# Altium footprint library HEKR V1.1 PCB封装.PcbLib: 2 footprints
Each footprint in its own frame and in the unit in brackets; x right, y up, seen from the top. Pads: shape width x height; smd on the part's side, far side on the other; paste and mask are expansions set on the pad; w line width, h text height; cw(c..) or ccw(c..) is an arc to the next point about the centre after c.
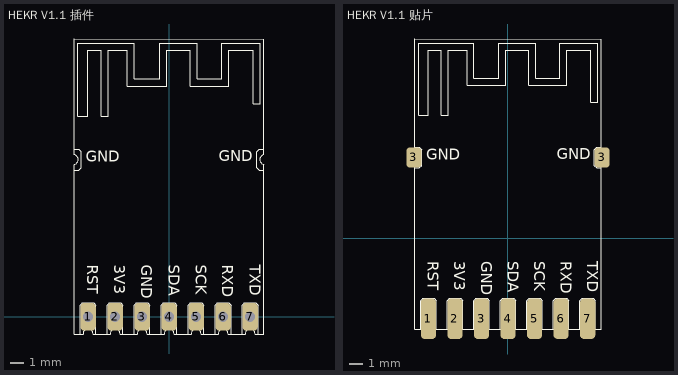
[diagram p0: the footprints below, top view; thin cyan lines are the x and y axes]

## HEKR V1.1 插件 [mil]
pads (7):
  rrect50% 45x80 hole 30: 1(-236.22,0) 2(-157.48,0) 3(-78.74,0) 4(0,0) 5(78.74,0) 6(157.48,0) 7(236.22,0)
Top Overlay:
  circle w1: c236.23,0 r14.65
  circle w1: c157.49,0 r14.65
  circle w1: c78.75,0 r14.65
  circle w1: c0.01,0 r14.65
  circle w1: c-78.73,0 r14.65
  circle w1: c-157.47,0 r14.65
  circle w1: c-236.21,0 r14.65
  lines w1: -276.94,427.82 -263.18,427.82 -256.39,434.61 -256.39,481.98 -257.44,483.03 -263.56,489.15 -276.94,489.15 ; -276.94,428.02 -276.94,443.99 ccw(c-279.42,458.42) -276.96,472.87 -276.96,489 ; -276.95,428.14 -276.95,-51.17 -259.21,-51.17 -250.81,-51.17 ; -276.95,488.79 -276.95,809.96 276.6,809.9 276.6,488.99 ; -259.24,-51.17 -259.24,33.79 -253.16,39.87 -252.68,40.36 -219.64,40.36 -213.11,33.83 -213.11,-51.17 ; -213.28,-51.17 -180.55,-51.18 ; -180.5,-51.17 -180.5,33.79 -174.42,39.87 -173.93,40.36 -140.9,40.36 -134.37,33.83 -134.37,-51.17 ; -180.45,-51.17 -172.07,-51.17 ; -172.08,-51.15 cw(c-157.47,-50) -142.86,-51.2 -134.67,-51.2 ; -134.68,-51.18 -101.73,-51.18 ; -101.76,-51.17 -101.76,33.79 -95.68,39.87 -95.19,40.36 -62.16,40.36 -55.63,33.83 -55.63,-51.17 ; -101.71,-51.17 -93.33,-51.17 ; -55.91,-51.17 -55.93,-51.2 -64.12,-51.2 ccw(c-78.73,-50) -93.34,-51.15 ; -55.74,-51.19 -22.62,-51.19 ; -23.02,-51.17 -23.02,33.79 -16.94,39.87 -16.45,40.36 16.58,40.36 23.11,33.83 23.11,-51.17 ; -22.97,-51.17 -14.59,-51.17 ; 22.56,-51.2 56.09,-51.2 ; 22.83,-51.17 22.81,-51.2 14.62,-51.2 ccw(c0.01,-50) -14.6,-51.15 ; 55.72,-51.17 55.72,33.79 61.8,39.87 62.29,40.36 95.32,40.36 101.85,33.83 101.85,-51.17 ; 55.77,-51.17 64.15,-51.17 ; 101.27,-51.2 134.63,-51.21 ; 134.46,-51.17 134.46,33.79 140.54,39.87 141.03,40.36 174.06,40.36 180.59,33.83 180.59,-51.17 ; 134.51,-51.17 142.89,-51.17 ; 213.2,-51.17 213.2,33.79 219.28,39.87 219.77,40.36 252.8,40.36 259.33,33.83 259.33,-51.17 ; 213.25,-51.17 221.63,-51.17 ; 213.39,-51.21 180.32,-51.21 ; 221.62,-51.15 cw(c236.23,-50) 250.84,-51.2 259.03,-51.2 ; 259.09,-51.22 276.6,-51.22 276.6,427.73 ; 262.83,489.02 276.6,489.02 ; 263.22,427.7 276.6,427.7 ; 276.58,428.01 276.58,443.98 ; 276.58,443.97 cw(c279.06,458.41) 276.6,472.86 ; 276.6,488.83 276.6,472.86 ; 276.58,489.14 263.2,489.14 257.08,483.02 256.03,481.97 256.03,434.6 262.81,427.81 276.58,427.81 276.61,427.84 276.61,443.98 ; -250.82,-51.15 cw(c-236.21,-50) -221.61,-51.2 -213.41,-51.2 ; -250.81,-51.17 -250.81,-51.17 ; -213.41,-51.2 -213.39,-51.17 ; -172.07,-51.17 -172.07,-51.17 ; -134.67,-51.2 -134.65,-51.17 ; -93.33,-51.17 -93.33,-51.17 ; -14.59,-51.17 -14.59,-51.17 ; 64.14,-51.15 cw(c78.75,-50) 93.36,-51.2 101.55,-51.2 ; 64.15,-51.17 64.15,-51.17 ; 101.55,-51.2 101.57,-51.17 ; 142.88,-51.15 cw(c157.49,-50) 172.1,-51.2 180.29,-51.2 ; 142.89,-51.17 142.89,-51.17 ; 180.29,-51.2 180.31,-51.17 ; 221.63,-51.17 221.63,-51.17 ; 259.03,-51.2 259.05,-51.17 ; 276.61,443.98 cw(c279.07,458.42) 276.6,472.86 ; 276.6,472.86 276.6,488.99 ; -265.49,584.46 -265.49,797.36 -101.15,797.36 -101.15,693.45 -26.94,693.45 -26.94,797.54 82.67,797.54 82.67,693.53 153.6,693.53 153.6,797.82 265.87,797.82 265.87,621.89 245.33,621.89 245.33,776.97 173.86,776.97 173.86,672.9 61.85,672.9 61.85,776.77 -6.24,776.77 -6.24,672.9 -121.43,672.9 -121.43,776.58 -177.26,776.58 -177.26,584.3 -197.97,584.3 -197.97,776.56 -236.63,776.56 -236.63,584.45 -265.49,584.46
  text "GND" at 144.91,441.99 h55
  text "GND" at -242.52,440.31 h55
  text "TXD" at 222.93,151.36 h55
  text "RXD" at 144.06,151.31 h55
  text "SCK" at 65.65,151.36 h55
  text "SDA" at -13.22,151.36 h55
  text "GND" at -92.1,151.36 h55
  text "3V3" at -170.97,151.31 h55
  text "RST" at -249.85,151.31 h55

## HEKR V1.1 贴片 [mil]
pads (9):
  rrect50% 45x120 smd: 1(-236.04,-239.21) 2(-157.3,-239.21) 3(-78.56,-239.21) 4(0.18,-239.21) 5(78.92,-239.21) 6(157.66,-239.21) 7(236.41,-239.21)
  rrect50% 45x60 smd: 3(-279.25,239.21) 3(279.25,239.21)
Top Overlay:
  circle w1: c236.42,-219.21 r14.65
  circle w1: c157.68,-219.21 r14.65
  circle w1: c78.94,-219.21 r14.65
  circle w1: c0.2,-219.21 r14.65
  circle w1: c-78.54,-219.21 r14.65
  circle w1: c-157.28,-219.21 r14.65
  circle w1: c-236.02,-219.21 r14.65
  lines w1: -276.78,269.79 -276.78,253.66 cw(c-279.24,239.21) -276.76,224.77 -276.76,208.81 ; -276.76,208.61 -262.99,208.61 -256.21,215.39 -256.21,262.77 -257.26,263.82 -263.38,269.94 -276.76,269.94 ; -276.77,208.93 -276.77,-270.38 -259.02,-270.38 -250.62,-270.38 ; -276.77,269.58 -276.77,590.74 276.78,590.69 276.78,269.77 ; -259.06,-270.38 -259.06,-185.42 -252.98,-179.34 -252.49,-178.86 -219.46,-178.86 -212.93,-185.39 -212.93,-270.39 ; -250.63,-270.36 cw(c-236.02,-269.21) -221.42,-270.41 -213.23,-270.41 -213.2,-270.39 ; -213.09,-270.39 -180.37,-270.39 ; -180.32,-270.38 -180.32,-185.42 -174.24,-179.34 -173.75,-178.86 -140.72,-178.86 -134.19,-185.39 -134.19,-270.39 ; -180.27,-270.38 -171.88,-270.38 ; -171.89,-270.36 cw(c-157.28,-269.21) -142.68,-270.41 -134.49,-270.41 ; -134.46,-270.39 -134.49,-270.41 ; -101.58,-270.38 -101.58,-185.42 -95.5,-179.34 -95.01,-178.86 -61.98,-178.86 -55.45,-185.39 -55.45,-270.39 ; -93.15,-270.36 cw(c-78.54,-269.21) -63.94,-270.41 -55.75,-270.41 -55.72,-270.39 ; -55.56,-270.4 -22.43,-270.4 ; -22.84,-270.38 -22.84,-185.42 -16.76,-179.34 -16.27,-178.86 16.76,-178.86 23.29,-185.39 23.29,-270.39 ; -22.79,-270.38 -14.4,-270.38 ; -14.41,-270.36 cw(c0.2,-269.21) 14.8,-270.41 22.99,-270.41 ; 22.75,-270.41 56.27,-270.41 ; 55.9,-270.38 55.9,-185.42 61.98,-179.34 62.47,-178.86 95.5,-178.86 102.03,-185.39 102.03,-270.39 ; 55.95,-270.38 64.34,-270.38 ; 64.33,-270.36 cw(c78.94,-269.21) 93.54,-270.41 101.73,-270.41 ; 101.46,-270.42 134.81,-270.42 ; 134.64,-270.38 134.64,-185.42 140.72,-179.34 141.21,-178.86 174.24,-178.86 180.77,-185.39 180.77,-270.39 ; 134.69,-270.38 143.08,-270.38 ; 143.07,-270.36 cw(c157.68,-269.21) 172.28,-270.41 180.47,-270.41 180.5,-270.39 213.58,-270.43 ; 213.38,-270.38 213.38,-185.42 219.46,-179.34 219.95,-178.86 252.98,-178.86 259.51,-185.39 259.51,-270.39 ; 213.43,-270.38 221.82,-270.38 ; 221.81,-270.36 cw(c236.42,-269.21) 251.02,-270.41 259.21,-270.41 259.24,-270.39 ; 259.28,-270.43 276.78,-270.43 276.78,208.52 263.4,208.48 ; 263.02,269.81 276.78,269.81 276.78,253.65 ; 276.76,208.6 263,208.6 256.21,215.38 256.21,262.76 257.26,263.81 263.38,269.93 276.76,269.93 ; 276.76,208.8 276.76,224.76 cw(c279.24,239.2) 276.78,253.65 ; 276.78,208.61 276.8,208.63 276.8,224.76 cw(c279.26,239.21) 276.78,253.65 ; 276.78,269.61 276.78,253.65 ; -250.62,-270.38 -250.62,-270.38 ; -171.88,-270.38 -171.88,-270.38 ; -134.5,-270.39 -101.55,-270.4 -93.14,-270.38 ; -93.14,-270.38 -93.14,-270.38 ; -14.4,-270.38 -14.4,-270.38 ; 22.99,-270.41 23.02,-270.39 ; 64.34,-270.38 64.34,-270.38 ; 101.73,-270.41 101.76,-270.39 ; 143.08,-270.38 143.08,-270.38 ; 221.82,-270.38 221.82,-270.38 ; -265.31,365.25 -265.31,578.15 -100.97,578.15 -100.97,474.24 -26.76,474.24 -26.76,578.32 82.85,578.32 82.85,474.32 153.78,474.32 153.78,578.61 266.05,578.61 266.05,402.68 245.51,402.68 245.51,557.76 174.04,557.76 174.04,453.69 62.04,453.69 62.04,557.56 -6.05,557.56 -6.05,453.69 -121.25,453.69 -121.25,557.37 -177.07,557.37 -177.07,365.09 -197.79,365.09 -197.79,557.35 -236.45,557.35 -236.45,365.24 -265.31,365.25
  text "GND" at 145.1,222.78 h55
  text "GND" at -242.33,221.1 h55
  text "TXD" at 223.12,-67.85 h55
  text "RXD" at 144.24,-67.9 h55
  text "SCK" at 65.84,-67.85 h55
  text "SDA" at -13.04,-67.85 h55
  text "GND" at -91.91,-67.85 h55
  text "3V3" at -170.79,-67.9 h55
  text "RST" at -249.67,-67.9 h55